# Altium footprint library aiskylab-01Resistors.PcbLib: 208 footprints (part 7 of 13)
Each footprint in its own frame and in the unit in brackets; x right, y up, seen from the top. Pads: shape width x height; smd on the part's side, far side on the other; paste and mask are expansions set on the pad; w line width, h text height; cw(c..) or ccw(c..) is an arc to the next point about the centre after c.
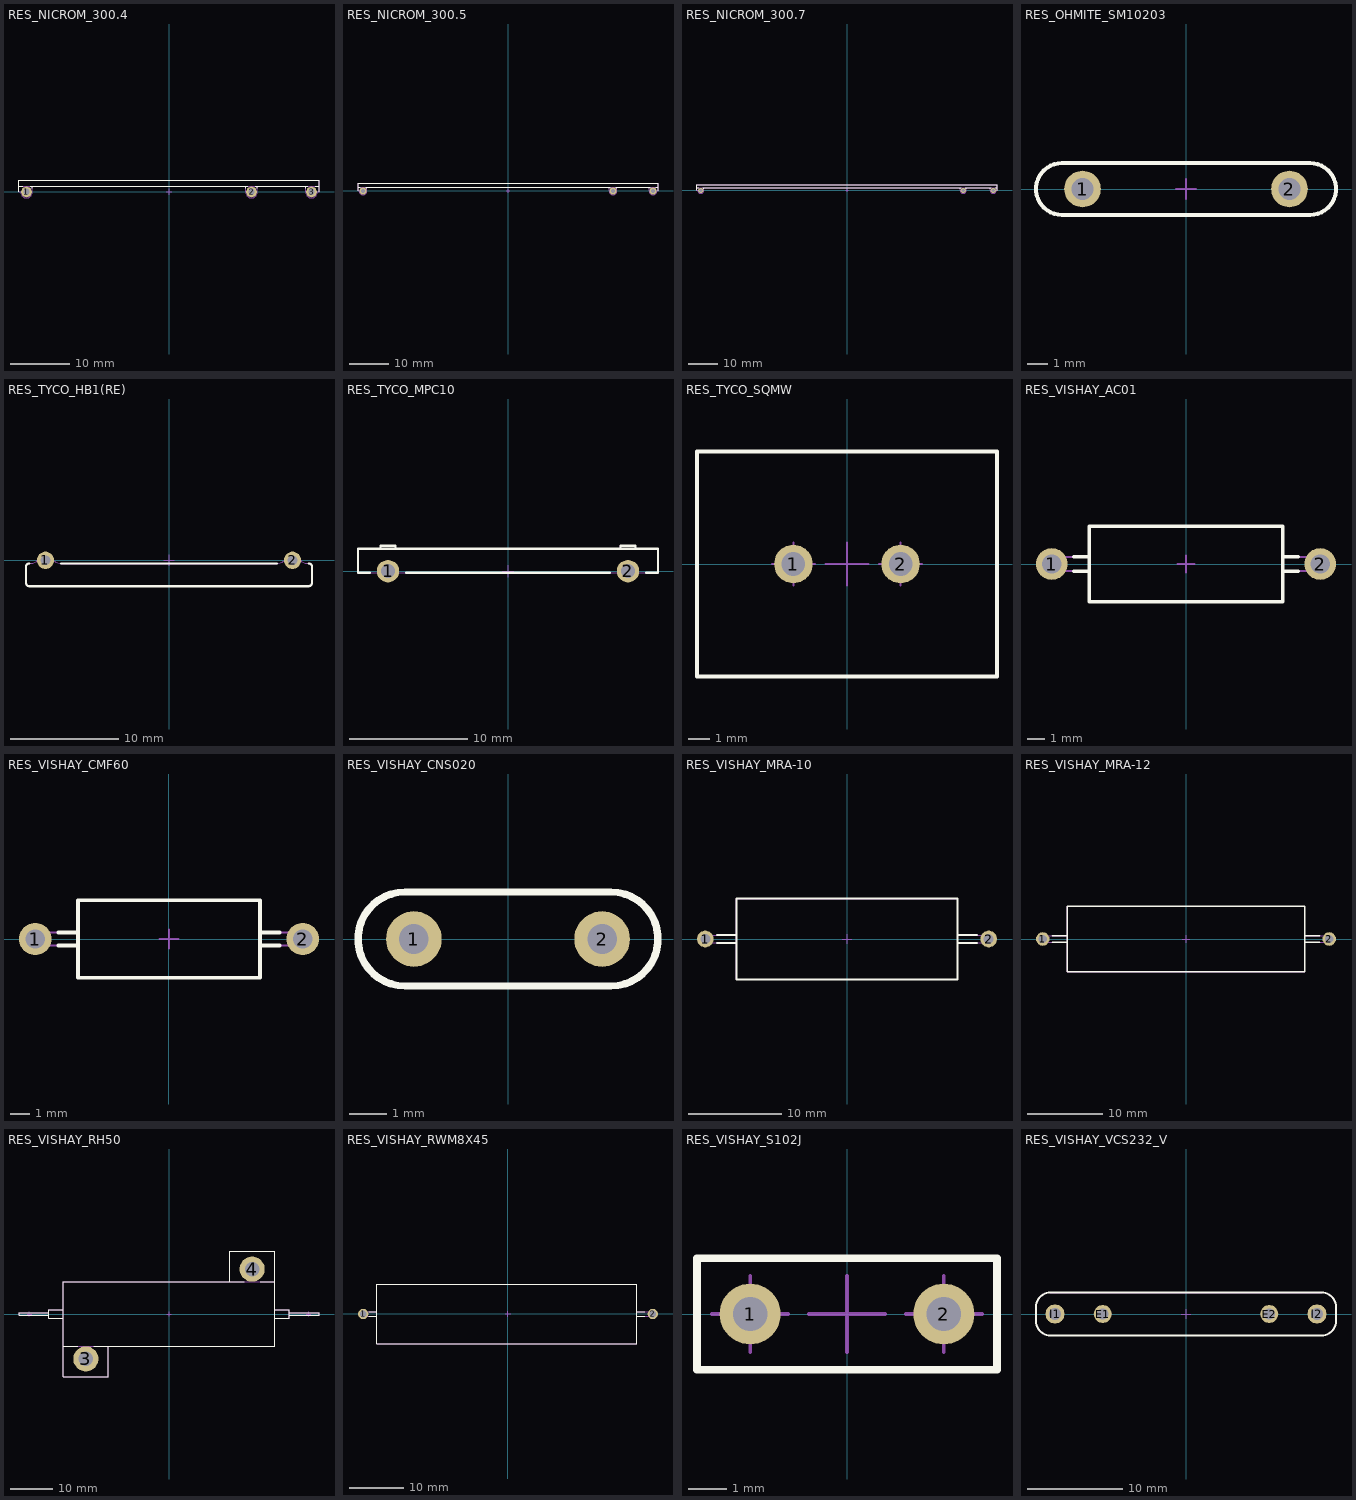
[diagram p6: the footprints below, top view; thin cyan lines are the x and y axes]

## RES_NICROM_300.4 [mm] "High Voltage Divider NICROM 300.4"
height 15.24
pads (3):
  round 1.8 hole 1.1: 1(-24.13,0) 2(13.97,0) 3(24.13,0)
Top Overlay:
  lines w0.2: -25.4,0 -25.4,1 ; -24.793,1 -25.4,1 ; -23.467,1 13.307,1 ; -23.13,0.663 -23.13,1 ; 12.97,0.663 12.97,1 ; 14.633,1 23.467,1 ; 14.97,0.663 14.97,1 ; 23.13,0.663 23.13,1 ; 24.793,1 25.4,1 ; 25.4,0 25.4,1 ; -25.4,1 -25.4,2 ; -25.4,1 -25.4,2 ; -25.4,2 25.4,2 25.4,1
Top Designator:
  text ".Designator" at -7.618,0.017 h1.52
Top Assembly:
  lines w0.1: -23.13,1 -23.13,0 cw(c-24.13,0) -25.13,0 ; 12.97,1 12.97,0 ccw(c13.97,0) 14.97,0 14.97,1 ; 23.13,1 23.13,0 ccw(c24.13,0) 25.13,0 25.4,0 25.4,1 ; -25.4,0 -25.13,0 ; -25.4,0 -25.4,1 ; -25.4,0 -25.13,0 ; -25.4,1 -25.4,2 ; -25.4,1 -25.4,2 ; -25.4,1 25.4,1 ; -25.4,2 25.4,2 ; 25.4,1 25.4,2 ; 25.4,1 25.4,2
Top Dimensions:
  lines w0.1: -24.63,0 -24.13,0 ; -24.13,-0.5 -24.13,0 ; -24.13,0.5 -24.13,0 ; -23.63,0 -24.13,0 ; -0.5,0 0,0 ; 0,-0.5 0,0 ; 0,0.5 0,0 ; 0.5,0 0,0 ; 13.47,0 13.97,0 ; 13.97,-0.5 13.97,0 ; 13.97,0.5 13.97,0 ; 14.47,0 13.97,0 ; 23.63,0 24.13,0 ; 24.13,-0.5 24.13,0 ; 24.13,0.5 24.13,0 ; 24.63,0 24.13,0
3D body "v200-130.stp": height 0.02, standoff -1.65, extent -25.13,-1 -23.13,1
3D body "v200-130.stp": height 0.02, standoff -1.65, extent 12.97,-1 14.97,1
3D body "v200-130.stp": height 0.02, standoff -1.65, extent 23.13,-1 25.13,1
3D body "RES_NICROM_300.4.stp": height 20.24, standoff -3.6, extent -25.4,-0.992 25.4,2

## RES_NICROM_300.5 [mm] "High Voltage Divider NICROM 300.5"
height 15.24
pads (3):
  round 1.8 hole 1.1: 1(-36.83,0) 2(26.67,0) 3(36.83,0)
Top Overlay:
  lines w0.2: -38.1,0 -38.1,1 ; -37.493,1 -38.1,1 ; -36.167,1 26.007,1 ; -35.83,0.663 -35.83,1 ; 25.67,0.663 25.67,1 ; 27.333,1 36.167,1 ; 27.67,0.663 27.67,1 ; 35.83,0.663 35.83,1 ; 37.493,1 38.1,1 ; 38.1,0 38.1,1 ; -38.1,1 -38.1,2 ; -38.1,1 -38.1,2 ; -38.1,2 38.1,2 38.1,1
Top Designator:
  text ".Designator" at -7.618,0.017 h1.52
Top Assembly:
  lines w0.1: -35.83,1 -35.83,0 cw(c-36.83,0) -37.83,0 ; 25.67,1 25.67,0 ccw(c26.67,0) 27.67,0 27.67,1 ; 35.83,1 35.83,0 ccw(c36.83,0) 37.83,0 38.1,0 38.1,1 ; -38.1,0 -37.83,0 ; -38.1,0 -38.1,1 ; -38.1,0 -37.83,0 ; -38.1,1 -38.1,2 ; -38.1,1 -38.1,2 ; -38.1,1 38.1,1 ; -38.1,2 38.1,2 ; 38.1,1 38.1,2 ; 38.1,1 38.1,2
Top Dimensions:
  lines w0.1: -37.33,0 -36.83,0 ; -36.83,-0.5 -36.83,0 ; -36.83,0.5 -36.83,0 ; -36.33,0 -36.83,0 ; -0.5,0 0,0 ; 0,-0.5 0,0 ; 0,0.5 0,0 ; 0.5,0 0,0 ; 26.17,0 26.67,0 ; 26.67,-0.5 26.67,0 ; 26.67,0.5 26.67,0 ; 27.17,0 26.67,0 ; 36.33,0 36.83,0 ; 36.83,-0.5 36.83,0 ; 36.83,0.5 36.83,0 ; 37.33,0 36.83,0
3D body "v200-130.stp": height 0.02, standoff -1.65, extent -37.83,-1 -35.83,1
3D body "v200-130.stp": height 0.02, standoff -1.65, extent 25.67,-1 27.67,1
3D body "v200-130.stp": height 0.02, standoff -1.65, extent 35.83,-1 37.83,1
3D body "RES_NICROM_300.5.stp": height 20.24, standoff -3.6, extent -38.1,-1 38.1,2

## RES_NICROM_300.7 [mm] "High Voltage Divider NICROM 300.7"
height 15.24
pads (3):
  round 1.8 hole 1.1: 1(-49.53,0) 2(39.37,0) 3(49.53,0)
Top Overlay:
  lines w0.2: -50.8,0 -50.8,1 ; -50.193,1 -50.8,1 ; -48.867,1 38.707,1 ; -48.53,0.663 -48.53,1 ; 38.37,0.663 38.37,1 ; 40.033,1 48.867,1 ; 40.37,0.663 40.37,1 ; 48.53,0.663 48.53,1 ; 50.193,1 50.8,1 ; 50.8,0 50.8,1 ; -50.8,1 -50.8,2 ; -50.8,1 -50.8,2 ; -50.8,2 50.8,2 50.8,1
Top Designator:
  text ".Designator" at -7.618,0.017 h1.52
Top Assembly:
  lines w0.1: -48.53,1 -48.53,0 cw(c-49.53,0) -50.53,0 ; 38.37,1 38.37,0 ccw(c39.37,0) 40.37,0 40.37,1 ; 48.53,1 48.53,0 ccw(c49.53,0) 50.53,0 50.8,0 50.8,1 ; -50.8,0 -50.53,0 ; -50.8,0 -50.8,1 ; -50.8,0 -50.53,0 ; -50.8,1 50.8,1 ; -50.8,1 -50.8,2 ; -50.8,1 -50.8,2 ; -50.8,2 50.8,2 ; 50.8,1 50.8,2 ; 50.8,1 50.8,2
Top Dimensions:
  lines w0.1: -50.03,0 -49.53,0 ; -49.53,-0.5 -49.53,0 ; -49.53,0.5 -49.53,0 ; -49.03,0 -49.53,0 ; -0.5,0 0,0 ; 0,-0.5 0,0 ; 0,0.5 0,0 ; 0.5,0 0,0 ; 38.87,0 39.37,0 ; 39.37,-0.5 39.37,0 ; 39.37,0.5 39.37,0 ; 39.87,0 39.37,0 ; 49.03,0 49.53,0 ; 49.53,-0.5 49.53,0 ; 49.53,0.5 49.53,0 ; 50.03,0 49.53,0
3D body "RES_NICROM_300.7.stp": height 20.24, standoff -3.6, extent -50.8,-1 50.8,2
3D body "v200-130.stp": height 0.02, standoff -1.65, extent 38.37,-1 40.37,1
3D body "v200-130.stp": height 0.02, standoff -1.65, extent -50.425,-0.95 -48.425,1.05
3D body "v200-130.stp": height 0.02, standoff -1.65, extent 48.53,-1 50.53,1

## RES_OHMITE_SM10203 [mm] "Resistor, Radial, Pad spacing 10.16mm - Body 14.73mm X 2.54mm X 8.64mm H"
height 8.64
pads (2):
  round 1.8 hole 1.1: 1(-5.08,0) 2(5.08,0)
Top Overlay:
  lines w0.2: -6.095,-1.27 cw(c-6.095,0) -6.095,1.27 6.095,1.27 cw(c6.095,0) 6.095,-1.27 -6.095,-1.27
Top Designator:
  text ".Designator" at -7.618,-0.508 h1.52
Top Assembly:
  lines w0.1: -6.095,-1.27 cw(c-6.095,0) -6.095,1.27 6.095,1.27 cw(c6.095,0) 6.095,-1.27 -6.095,-1.27
Top Component Center:
  lines w0.1: -5.58,0 -5.08,0 ; -5.08,-0.5 -5.08,0 ; -5.08,0.5 -5.08,0 ; -4.58,0 -5.08,0 ; -0.5,0 0,0 ; 0,-0.5 0,0 ; 0,0.5 0,0 ; 0.5,0 0,0 ; 4.58,0 5.08,0 ; 5.08,-0.5 5.08,0 ; 5.08,0.5 5.08,0 ; 5.58,0 5.08,0
3D body "v200-130.stp": height 0.02, standoff -1.65, extent -6.08,-1 -4.08,1
3D body "v200-130.stp": height 0.02, standoff -1.65, extent 4.08,-1 6.08,1
3D body "RES_OHMITE_SM10203.stp": height 9.14, standoff -3.6, extent -7.365,-1.27 7.365,1.27

## RES_TYCO_HB1(RE) [mm] "Resistor, Radial, Leads spacing 22.9mm - Body 26.5mm X 3mm X 10.4mm H"
height 10.4
pads (2):
  round 1.6 hole 0.9: 1(-11.45,0) 2(11.45,0)
Top Overlay:
  lines w0.2: -12.95,-0.3 ccw(c-12.95,-0.6) -13.25,-0.6 -13.25,-2.1 ccw(c-12.95,-2.1) -12.95,-2.4 12.95,-2.4 ccw(c12.95,-2.1) 13.25,-2.1 13.25,-0.6 ccw(c12.95,-0.6) 12.95,-0.3 ; -10.011,-0.3 10.011,-0.3
Top Designator:
  text ".Designator" at -7.618,-1.258 h1.52
Top Assembly:
  lines w0.1: 11.983,0.259 ccw(c11.446,0.007) 10.91,0.263 cw(c10.011,0.7) 10.011,-0.3 -10.011,-0.3 cw(c-10.011,0.7) -10.91,0.263 ccw(c-11.45,0) -11.99,0.263 cw(c-12.893,0.704) -12.95,-0.3 ccw(c-12.95,-0.6) -13.25,-0.6 -13.25,-2.1 ccw(c-12.95,-2.1) -12.95,-2.4 12.95,-2.4 ccw(c12.95,-2.1) 13.25,-2.1 13.25,-0.6 ccw(c12.95,-0.6) 12.95,-0.3 cw(c12.893,0.704) 11.99,0.263
Top Dimensions:
  lines w0.1: -11.95,0 -11.45,0 ; -11.45,-0.5 -11.45,0 ; -11.45,0.5 -11.45,0 ; -10.95,0 -11.45,0 ; -0.5,0 0,0 ; 0,-0.5 0,0 ; 0,0.5 0,0 ; 0.5,0 0,0 ; 10.95,0 11.45,0 ; 11.45,-0.5 11.45,0 ; 11.45,0.5 11.45,0 ; 11.95,0 11.45,0
3D body "v200-130.stp": height 0.02, standoff -1.65, extent -12.45,-1 -10.45,1
3D body "v200-130.stp": height 0.02, standoff -1.65, extent 10.45,-1 12.45,1
3D body "RES_TYCO_HB1(RE).stp": height 18.4, standoff -2.1, extent -13.25,-2.4 13.25,0.6

## RES_TYCO_MPC10 [mm] "Resistor, Radial, Leads spacing 20.32mm - Body 25.4mm X 2.54mm X 27.68mm H"
height 27.68
pads (2):
  round 1.9 hole 1.2: 1(-10.16,0) 2(10.16,0)
Top Overlay:
  lines w0.2: -11.705,-0.127 -12.7,-0.127 -12.7,1.905 12.7,1.905 12.7,-0.127 11.705,-0.127 ; -10.795,1.905 -10.795,2.159 -9.525,2.159 -9.525,1.905 ; -8.615,-0.127 8.615,-0.127 ; 9.525,1.905 9.525,2.159 10.795,2.159 10.795,1.905
Top Designator:
  text ".Designator" at -7.618,0.096 h1.52
Top Assembly:
  lines w0.1: -10.795,-0.127 -10.795,-0.381 -9.525,-0.381 -9.525,-0.127 ; -10.795,1.905 -10.795,2.159 -9.525,2.159 -9.525,1.905 ; 9.525,-0.127 9.525,-0.381 10.795,-0.381 10.795,-0.127 ; 9.525,1.905 9.525,2.159 10.795,2.159 10.795,1.905 ; -12.7,-0.127 -12.7,1.905 12.7,1.905 12.7,-0.127 -12.7,-0.127
Top Dimensions:
  lines w0.1: -10.66,0 -10.16,0 ; -10.16,-0.5 -10.16,0 ; -10.16,0.5 -10.16,0 ; -9.66,0 -10.16,0 ; -0.5,0 0,0 ; 0,-0.5 0,0 ; 0,0.5 0,0 ; 0.5,0 0,0 ; 9.66,0 10.16,0 ; 10.16,-0.5 10.16,0 ; 10.16,0.5 10.16,0 ; 10.66,0 10.16,0
3D body "v200-130.stp": height 0.02, standoff -1.65, extent -11.16,-1 -9.16,1
3D body "v200-130.stp": height 0.02, standoff -1.65, extent 9.16,-1 11.16,1
3D body "RES_TYCO_MPC10.stp": height 27.68, standoff -3.17, extent -12.7,-0.381 12.7,2.159

## RES_TYCO_SQMW [mm] "Resistor, Radial, Pad spacing 5mm - Body 14mm X 10.5mm X 40mm H"
height 40
pads (2):
  round 1.8 hole 1.1: 1(-2.5,0) 2(2.5,0)
Top Overlay:
  lines w0.2: -7,-5.25 7,-5.25 7,5.25 -7,5.25 -7,-5.25
Top Designator:
  text ".Designator" at -7.618,-0.508 h1.52
Top Assembly:
  lines w0.1: -7,-5.25 -7,5.25 7,5.25 7,-5.25 -7,-5.25
Top Dimensions:
  lines w0.1: -3.5,0 -2.5,0 ; -2.5,-1 -2.5,0 ; -2.5,1 -2.5,0 ; -1.5,0 -2.5,0 ; -1,0 0,0 ; 0,-1 0,0 ; 0,1 0,0 ; 1,0 0,0 ; 1.5,0 2.5,0 ; 2.5,-1 2.5,0 ; 2.5,1 2.5,0 ; 3.5,0 2.5,0
3D body "v200-130.stp": height 0.02, standoff -1.65, extent -3.5,-1 -1.5,1
3D body "v200-130.stp": height 0.02, standoff -1.65, extent 1.5,-1 3.5,1
3D body "RES_TYCO_SQMW.stp": height 40, standoff -3.5, extent -7,-5.25 7,5.25

## RES_VISHAY_AC01 [mm] "Resistor, Axial, Pad spacing 15.24 mm - Body Lengh 11mm X Body Diameter 4.3mm"
height 4.3
pads (2):
  round 1.8 hole 1.1: 1(-7.62,0) 2(7.62,0)
Top Overlay:
  lines w0.2: -6.383,-0.4 -5.5,-0.4 ; -6.383,0.4 -5.5,0.4 ; 5.5,-0.4 6.383,-0.4 ; 5.5,0.4 6.383,0.4 ; -5.5,-2.15 5.5,-2.15 5.5,2.15 -5.5,2.15 -5.5,-2.15
Top Designator:
  text ".Designator" at -7.618,-0.508 h1.52
Top Assembly:
  lines w0.1: -5.5,-0.4 -7.62,-0.4 cw(c-7.62,0) -7.62,0.4 -5.5,0.4 ; 5.5,-0.4 7.62,-0.4 ccw(c7.62,0) 7.62,0.4 5.5,0.4 ; -5.5,-2.15 -5.5,2.15 5.5,2.15 5.5,-2.15 -5.5,-2.15
Top Dimensions:
  lines w0.1: -8.12,0 -7.62,0 ; -7.62,-0.5 -7.62,0 ; -7.62,0.5 -7.62,0 ; -7.12,0 -7.62,0 ; -0.5,0 0,0 ; 0,-0.5 0,0 ; 0,0.5 0,0 ; 0.5,0 0,0 ; 7.12,0 7.62,0 ; 7.62,-0.5 7.62,0 ; 7.62,0.5 7.62,0 ; 8.12,0 7.62,0
3D body "v200-130.stp": height 0.02, standoff -1.65, extent -8.62,-1 -6.62,1
3D body "v200-130.stp": height 0.02, standoff -1.65, extent 6.62,-1 8.62,1
3D body "RES_VISHAY_AC01.stp": height 4.3, standoff -3.8, extent -8.02,-2.15 8.02,2.15

## RES_VISHAY_CMF60 [mm] "Resistor, Axial, Pad spacing 13 mm - Body Lengh 8.74mm X Body Diameter 3.68mm"
height 4.06
pads (2):
  round 1.7 hole 1: 1(-7,0) 2(7,0)
Top Overlay:
  lines w0.2: -5.799,-0.345 -4.765,-0.345 ; -5.799,0.345 -4.765,0.345 ; 4.765,-0.345 5.799,-0.345 ; 4.765,0.345 5.799,0.345 ; -4.765,-2.03 4.765,-2.03 4.765,2.03 -4.765,2.03 -4.765,-2.03
Top Designator:
  text ".Designator" at -7.617,-0.508 h1.52
Top Assembly:
  lines w0.1: -4.765,-0.345 -7,-0.345 cw(c-7,0) -7,0.345 -4.765,0.345 ; 4.765,-0.345 7,-0.345 ccw(c7,0) 7,0.345 4.765,0.345 ; -4.765,-2.03 -4.765,2.03 4.765,2.03 4.765,-2.03 -4.765,-2.03
Top Dimensions:
  lines w0.1: -7.5,0 -7,0 ; -7,-0.5 -7,0 ; -7,0.5 -7,0 ; -6.5,0 -7,0 ; -0.5,0 0,0 ; 0,-0.5 0,0 ; 0,0.5 0,0 ; 0.5,0 0,0 ; 6.5,0 7,0 ; 7,-0.5 7,0 ; 7,0.5 7,0 ; 7.5,0 7,0
3D body "v200-130.stp": height 0.02, standoff -1.65, extent -8,-1 -6,1
3D body "v200-130.stp": height 0.02, standoff -1.65, extent 6,-1 8,1
3D body "RES_VISHAY_CMF60.stp": height 4.06, standoff -3.6, extent -7.345,-2.03 7.345,2.03

## RES_VISHAY_CNS020 [mm] "Resistor, Radial, Pad spacing 5.08mm - Body 8.1mm x 2.54mm"
height 6.62
pads (2):
  round 1.5 hole 0.8: 1(-2.54,0) 2(2.54,0)
Top Overlay:
  lines w0.2: -2.78,-1.27 cw(c-2.78,0) -2.78,1.27 2.78,1.27 cw(c2.78,0) 2.78,-1.27 -2.78,-1.27
Top Designator:
  text ".Designator" at -7.618,-0.508 h1.52
Top Assembly:
  lines w0.1: -2.78,-1.27 cw(c-2.78,0) -2.78,1.27 2.78,1.27 cw(c2.78,0) 2.78,-1.27 -2.78,-1.27
3D body "v200-130.stp": height 0.02, standoff -1.65, extent -3.54,-1 -1.54,1
3D body "v200-130.stp": height 0.02, standoff -1.65, extent 1.54,-1 3.54,1
3D body "RES_VISHAY_CNS020.stp": height 6.62, standoff -3.6, extent -4.05,-1.27 4.05,1.27

## RES_VISHAY_MRA-10 [mm] "Resistor, Axial, Pad spacing 30.48mm - Body Lengh 22.22mm X Body Diameter 7.92mm"
height 8.71
pads (2):
  round 1.8 hole 1.1: 1(-15.24,0) 2(15.24,0)
Top Overlay:
  lines w0.2: -14.011,-0.425 -11.895,-0.425 ; -14.011,0.425 -11.895,0.425 ; 11.895,-0.425 14.011,-0.425 ; 11.895,0.425 14.011,0.425 ; -11.895,-4.355 -11.895,4.355 11.895,4.355 11.895,-4.355 -11.895,-4.355
Top Designator:
  text ".Designator" at -7.618,-0.508 h1.52
Top Assembly:
  lines w0.1: -11.895,-0.425 -15.24,-0.425 cw(c-15.24,0) -15.24,0.425 -11.895,0.425 ; 11.895,-0.425 15.24,-0.425 ccw(c15.24,0) 15.24,0.425 11.895,0.425 ; -11.895,-4.355 -11.895,4.355 11.895,4.355 11.895,-4.355 -11.895,-4.355
Top Dimensions:
  lines w0.1: -15.74,0 -15.24,0 ; -15.24,-0.5 -15.24,0 ; -15.24,0.5 -15.24,0 ; -14.74,0 -15.24,0 ; -0.5,0 0,0 ; 0,-0.5 0,0 ; 0,0.5 0,0 ; 0.5,0 0,0 ; 14.74,0 15.24,0 ; 15.24,-0.5 15.24,0 ; 15.24,0.5 15.24,0 ; 15.74,0 15.24,0
3D body "v200-130.stp": height 0.02, standoff -1.65, extent -16.24,-1 -14.24,1
3D body "v200-130.stp": height 0.02, standoff -1.65, extent 14.24,-1 16.24,1
3D body "RES_VISHAY_RMA-10.stp": height 8.71, standoff -3.8, extent -15.665,-4.355 15.665,4.355

## RES_VISHAY_MRA-12 [mm] "Resistor, Axial, Pad spacing 38.1mm - Body Lengh 30.17mm X Body Diameter 7.92mm"
height 8.71
pads (2):
  round 1.8 hole 1.1: 1(-19.05,0) 2(19.05,0)
Top Overlay:
  lines w0.2: -17.821,-0.425 -15.765,-0.425 ; -17.821,0.425 -15.765,0.425 ; 15.765,-0.425 17.821,-0.425 ; 15.765,0.425 17.821,0.425 ; -15.765,-4.355 -15.765,4.355 15.765,4.355 15.765,-4.355 -15.765,-4.355
Top Designator:
  text ".Designator" at -7.618,-0.508 h1.52
Top Assembly:
  lines w0.1: -15.765,-0.425 -19.05,-0.425 cw(c-19.05,0) -19.05,0.425 -15.765,0.425 ; 15.765,-0.425 19.05,-0.425 ccw(c19.05,0) 19.05,0.425 15.765,0.425 ; -15.765,-4.355 -15.765,4.355 15.765,4.355 15.765,-4.355 -15.765,-4.355
Top Dimensions:
  lines w0.1: -19.55,0 -19.05,0 ; -19.05,-0.5 -19.05,0 ; -19.05,0.5 -19.05,0 ; -18.55,0 -19.05,0 ; -0.5,0 0,0 ; 0,-0.5 0,0 ; 0,0.5 0,0 ; 0.5,0 0,0 ; 18.55,0 19.05,0 ; 19.05,-0.5 19.05,0 ; 19.05,0.5 19.05,0 ; 19.55,0 19.05,0
3D body "v200-130.stp": height 0.02, standoff -1.65, extent -20.05,-1 -18.05,1
3D body "v200-130.stp": height 0.02, standoff -1.65, extent 18.05,-1 20.05,1
3D body "RES_VISHAY_MRA-12.stp": height 8.71, standoff -3.8, extent -19.475,-4.355 19.475,4.355

## RES_VISHAY_RH50 [mm] "Heatsink Encased Wirewound Power Resistors - Body Lengh 50mm X Body Width 15.5mm"
height 15
pads (2):
  round 6 hole 3.5: 3(-19.85,-10.7) 4(19.85,10.7)
Top Overlay:
  lines w0.2: -28.7,-0.25 -35.8,-0.25 -35.8,0.25 -28.7,0.25 ; -25.25,-7.75 -21.733,-7.75 ; -25.25,-1 -28.7,-1 -28.7,1 -25.25,1 ; -17.967,-7.75 25.25,-7.75 25.25,14.95 14.45,14.95 14.45,7.75 ; -14.45,-7.75 -14.45,-14.95 -25.25,-14.95 -25.25,7.75 17.967,7.75 ; 21.733,7.75 25.25,7.75 ; 25.25,-1 28.7,-1 28.7,1 25.25,1 ; 28.7,-0.25 35.8,-0.25 35.8,0.25 28.7,0.25
Top Designator:
  text ".Designator" at -7.618,-0.508 h1.52
Top Assembly:
  circle w0.1: c19.85,10.7 r1.6
  circle w0.1: c-19.85,-10.7 r1.6
  lines w0.1: -28.7,-0.25 -35.8,-0.25 -35.8,0.25 -28.7,0.25 ; -25.25,-7.75 25.25,-7.75 25.25,14.95 14.45,14.95 14.45,7.75 ; -25.25,-1 -28.7,-1 -28.7,1 -25.25,1 ; -14.45,-7.75 -14.45,-14.95 -25.25,-14.95 -25.25,7.75 25.25,7.75 ; 25.25,-1 28.7,-1 28.7,1 25.25,1 ; 28.7,-0.25 35.8,-0.25 35.8,0.25 28.7,0.25
Top Dimensions:
  lines w0.1: -33.8,0 -33.3,0 ; -33.3,-0.5 -33.3,0 ; -33.3,0.5 -33.3,0 ; -32.8,0 -33.3,0 ; -20.35,-10.7 -19.85,-10.7 ; -19.85,-11.2 -19.85,-10.7 ; -19.85,-10.2 -19.85,-10.7 ; -19.35,-10.7 -19.85,-10.7 ; 19.35,10.7 19.85,10.7 ; 19.85,10.2 19.85,10.7 ; 19.85,11.2 19.85,10.7 ; 20.35,10.7 19.85,10.7 ; 32.8,0 33.3,0 ; 33.3,-0.5 33.3,0 ; 33.3,0.5 33.3,0 ; 33.8,0 33.3,0 ; 0,0 0,0.5 0,0 ; 0,0 -0.5,0 0,0 ; 0,0 0,-0.5 0,0 ; 0,0 0.5,0 0,0
3D body "v200-130.stp": height 0.02, standoff -1.65, extent -20.85,-11.7 -18.85,-9.7
3D body "v200-130.stp": height 0.02, standoff -1.65, extent 18.85,9.7 20.85,11.7
3D body "RES_VISHAY_RH50.stp": height 15, standoff 0, extent -35.8,-14.95 35.8,14.95

## RES_VISHAY_RWM8X45 [mm] "Resistor, Axial, Leads Spacing 52mm, Lead Dia. 0.8, Body Lengh 45.8mm, Diameter 9.4mm"
height 10.9
pads (2):
  round 1.9 hole 1.2: 1(-26.67,0) 2(26.67,0)
Top Overlay:
  lines w0.2: -25.627,-0.45 -24.13,-0.45 ; -25.627,0.45 -24.13,0.45 ; 23.67,-0.45 25.167,-0.45 ; 23.67,0.45 25.167,0.45 ; -24.13,-5.45 -24.13,5.45 23.67,5.45 23.67,-5.45 -24.13,-5.45
Top Designator:
  text ".Designator" at -7.618,-0.508 h1.52
Top Assembly:
  lines w0.1: -24.13,-0.45 -26.9,-0.45 cw(c-26.9,0) -26.9,0.45 -24.13,0.45 ; 23.67,-0.45 26.44,-0.45 ccw(c26.44,0) 26.44,0.45 23.67,0.45 ; -24.13,-5.45 -24.13,5.45 23.67,5.45 23.67,-5.45 -24.13,-5.45
Top Dimensions:
  lines w0.1: -27.4,0 -26.9,0 ; -26.9,-0.5 -26.9,0 ; -26.9,0.5 -26.9,0 ; -26.4,0 -26.9,0 ; -0.5,0 0,0 ; 0,-0.5 0,0 ; 0,0.5 0,0 ; 0.5,0 0,0 ; 25.94,0 26.44,0 ; 26.44,-0.5 26.44,0 ; 26.44,0.5 26.44,0 ; 26.94,0 26.44,0
3D body "v200-130.stp": height 0.02, standoff -1.65, extent -27.67,-1 -25.67,1
3D body "v200-130.stp": height 0.02, standoff -1.65, extent 25.67,-1 27.67,1
3D body "RES_VISHAY_RWM8X45.stp": height 10.9, standoff -3.6, extent -27.12,-5.45 27.12,5.45

## RES_VISHAY_S102J [mm] "Resistor, Radial Rectangular, Leads  Spacing 5.08mm - Body 7.62mm X mm X 2.67mm"
height 8.53
pads (2):
  round 1.6 hole 0.9: 1(-2.54,0) 2(2.54,0)
Top Overlay:
  lines w0.2: -3.935,-1.46 3.935,-1.46 3.935,1.46 -3.935,1.46 -3.935,-1.46
Top Designator:
  text ".Designator" at -7.618,-0.508 h1.52
Top Assembly:
  lines w0.1: -3.935,-1.46 -3.935,1.46 3.935,1.46 3.935,-1.46 -3.935,-1.46
Top Dimensions:
  lines w0.1: -3.54,0 -2.54,0 ; -2.54,-1 -2.54,0 ; -2.54,1 -2.54,0 ; -1.54,0 -2.54,0 ; -1,0 0,0 ; 0,-1 0,0 ; 0,1 0,0 ; 1,0 0,0 ; 1.54,0 2.54,0 ; 2.54,-1 2.54,0 ; 2.54,1 2.54,0 ; 3.54,0 2.54,0
3D body "v200-130.stp": height 0.02, standoff -1.65, extent -3.54,-1 -1.54,1
3D body "v200-130.stp": height 0.02, standoff -1.65, extent 1.54,-1 3.54,1
3D body "RES_VISHAY_S102J.stp": height 7.87, standoff -3.8, extent -3.935,-1.46 3.935,1.46

## RES_VISHAY_VCS232_V [mm] "4 Leads Ultra High Precision Foil Power Current Sensing Resistor VCS232 Serie"
height 13
pads (4):
  round 1.9 hole 1.2: E1(-8.74,0) E2(8.74,0)
  round 2 hole 1.3: I1(-13.755,0) I2(13.755,0)
Top Overlay:
  lines w0.2: -15.75,-0.75 ccw(c-14.25,-0.75) -14.25,-2.25 14.25,-2.25 ccw(c14.25,-0.75) 15.75,-0.75 15.75,0.75 ccw(c14.25,0.75) 14.25,2.25 -14.25,2.25 ccw(c-14.25,0.75) -15.75,0.75 -15.75,-0.75
Top Designator:
  text ".Designator" at -7.618,-0.508 h1.52
Top Assembly:
  lines w0.1: -15.75,-0.75 ccw(c-14.25,-0.75) -14.25,-2.25 14.25,-2.25 ccw(c14.25,-0.75) 15.75,-0.75 15.75,0.75 ccw(c14.25,0.75) 14.25,2.25 -14.25,2.25 ccw(c-14.25,0.75) -15.75,0.75 -15.75,-0.75
Top Dimensions:
  lines w0.1: -14.255,0 -13.755,0 ; -13.755,-0.5 -13.755,0 ; -13.755,0.5 -13.755,0 ; -13.255,0 -13.755,0 ; -9.24,0 -8.74,0 ; -8.74,-0.5 -8.74,0 ; -8.74,0.5 -8.74,0 ; -8.24,0 -8.74,0 ; -0.5,0 0,0 ; 0,-0.5 0,0 ; 0,0.5 0,0 ; 0.5,0 0,0 ; 8.24,0 8.74,0 ; 8.74,-0.5 8.74,0 ; 8.74,0.5 8.74,0 ; 9.24,0 8.74,0 ; 13.255,0 13.755,0 ; 13.755,-0.5 13.755,0 ; 13.755,0.5 13.755,0 ; 14.255,0 13.755,0
3D body "v200-130.stp": height 0.02, standoff -1.65, extent -14.755,-1 -12.755,1
3D body "v200-130.stp": height 0.02, standoff -1.65, extent 12.755,-1 14.755,1
3D body "v200-130.stp": height 0.02, standoff -1.65, extent 7.74,-1 9.74,1
3D body "v200-130.stp": height 0.02, standoff -1.65, extent -9.74,-1 -7.74,1
3D body "RES_VISHAY_VCS232_v.stp": height 13, standoff -3.8, extent -15.75,-2.25 15.75,2.25